# Altium footprint library Gate Driver Board.PcbLib: 123 footprints (part 7 of 8)
Each footprint in its own frame and in the unit in brackets; x right, y up, seen from the top. Pads: shape width x height; smd on the part's side, far side on the other; paste and mask are expansions set on the pad; w line width, h text height; cw(c..) or ccw(c..) is an arc to the next point about the centre after c.
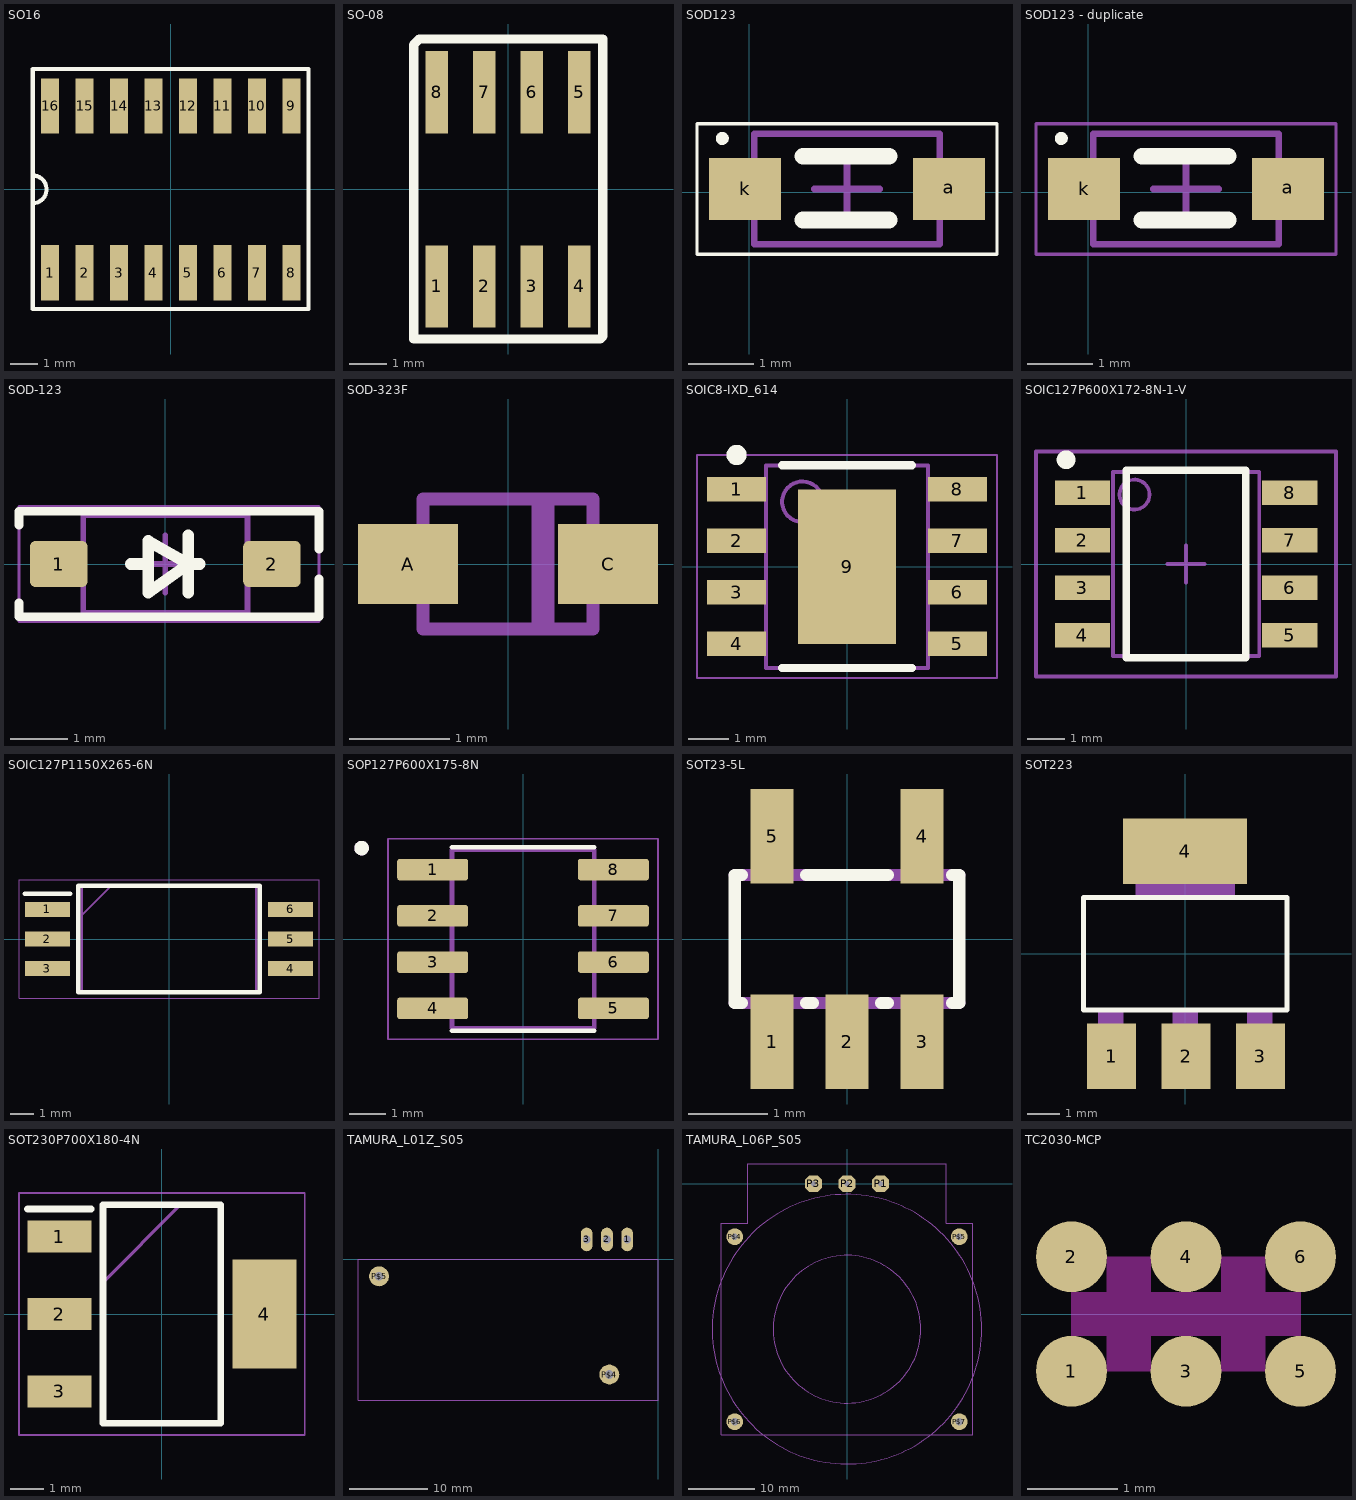
[diagram p6: the footprints below, top view; thin cyan lines are the x and y axes]

## SO16 [mil] "SO16"
pads (16):
  rect 26x80 smd: 1(-175,-121) 2(-125,-121) 3(-75,-121) 4(-25,-121) 5(25,-121) 6(75,-121) 7(125,-121) 8(175,-121) 9(175,121) 10(125,121) 11(75,121) 12(25,121) 13(-25,121) 14(-75,121) 15(-125,121) 16(-175,121)
Top Overlay:
  lines w6: -200,-20 ccw(c-200,0) -200,20 ; 200,-77 200,77 ; -200,-173.46 -200,-77 -200,174.44 200,174.44 200,-173.46 -183.03,-173.46 -200,-173.46
3D body "SOIC16 narrow.stp": height 78.74, standoff 0.13, extent -200.39,-122.31 196.46,120.34

## SO-08 [mm] "SO-08"
pads (8):
  rect 0.6x2.2 smd: 1(-1.905,-2.6) 2(-0.635,-2.6) 3(0.635,-2.6) 4(1.905,-2.6) 5(1.905,2.6) 6(0.635,2.6) 7(-0.635,2.6) 8(-1.905,2.6)
Top Overlay:
  lines w0.254: -2.525,-4.01 -2.1,-4.01 2.465,-4.01 2.533,-3.942 2.533,4.025 -2.375,4.025 -2.525,3.875 -2.525,-3.775 -2.525,-4.01
Assembly Bottom:
  region: -2.15,2 -2.15,3.1 -1.66,3.1 -1.66,2
  region: -0.88,2 -0.88,3.1 -0.39,3.1 -0.39,2
  region: 0.39,2 0.39,3.1 0.88,3.1 0.88,2
  region: 1.66,2 1.66,3.1 2.15,3.1 2.15,2
  region: 1.66,-3.1 1.66,-2 2.15,-2 2.15,-3.1
  region: 0.39,-3.1 0.39,-2 0.88,-2 0.88,-3.1
  region: -0.88,-3.1 -0.88,-2 -0.39,-2 -0.39,-3.1
  region: -2.15,-3.1 -2.15,-2 -1.66,-2 -1.66,-3.1
3D body: height 1.27, standoff 0, extent 1.605,1.5 2.205,3.7
3D body: height 1.27, standoff 0, extent 0.335,1.5 0.935,3.7
3D body: height 1.27, standoff 0, extent -2.205,1.5 -1.605,3.7
3D body: height 1.27, standoff 0, extent 1.605,-3.7 2.205,-1.5
3D body: height 1.27, standoff 0, extent 0.335,-3.7 0.935,-1.5
3D body: height 1.27, standoff 0, extent -2.205,-3.7 -1.605,-1.5
3D body: height 1.27, standoff 0, extent -0.935,1.5 -0.335,3.7
3D body: height 1.27, standoff 0, extent -0.935,-3.7 -0.335,-1.5
3D body: height 3.81, standoff 0, extent -2.15,2 -1.66,3.1
3D body: height 3.81, standoff 0, extent -0.88,2 -0.39,3.1
3D body: height 3.81, standoff 0, extent 0.39,2 0.88,3.1
3D body: height 3.81, standoff 0, extent 1.66,2 2.15,3.1
3D body: height 3.81, standoff 0, extent 1.66,-3.1 2.15,-2
3D body: height 3.81, standoff 0, extent 0.39,-3.1 0.88,-2
3D body: height 3.81, standoff 0, extent -0.88,-3.1 -0.39,-2
3D body: height 3.81, standoff 0, extent -2.15,-3.1 -1.66,-2
3D body "SOIC08 narrow.stp": height 2, standoff 0, extent 3.243,-1.675 9.407,3.325

## SOD123 [mm]
height 1.35
pads (2):
  rect 1.1x0.95 smd: a(3.063,0.05) k(-0.062,0.05)
Top Overlay:
  circle w0.1: c-0.412,0.825 r0.05
  lines w0.05: -0.8,-0.95 3.8,-0.95 3.8,1.05 -0.8,1.05 -0.8,-0.95
  lines w0.254: 0.825,-0.425 2.15,-0.425 ; 0.825,0.55 2.15,0.55
Assembly Top:
  lines w0.1: 0.075,-0.8 2.925,-0.8 2.925,0.9 0.075,0.9 0.075,-0.8
Courtyard Top:
  lines w0.1: 1,0.05 2,0.05 ; 1.5,-0.45 1.5,0.55
3D body "CircuitWorks-SOD123.STEP": height 1.28, standoff 0.01, extent -0.375,-0.775 3.325,0.825

## SOD123 - duplicate [mm]
height 1.35
pads (2):
  rect 1.1x0.95 smd: a(3.063,0.05) k(-0.062,0.05)
Top Overlay:
  circle w0.1: c-0.412,0.825 r0.05
  lines w0.254: 0.825,-0.425 2.15,-0.425 ; 0.825,0.55 2.15,0.55
Assembly Top:
  lines w0.1: 0.075,-0.8 0.075,0.9 2.925,0.9 2.925,-0.8 0.075,-0.8
Courtyard Top:
  lines w0.05: -0.8,-0.95 -0.8,1.05 3.8,1.05 3.8,-0.95 -0.8,-0.95
  lines w0.1: 1,0.05 2,0.05 ; 1.5,-0.45 1.5,0.55
3D body "CircuitWorks-SOD123.STEP": height 1.28, standoff 0.01, extent -0.375,-0.775 3.325,0.825

## SOD-123 [mm] "SOD, 2-Leads, Body 1.55x3.70mm, IPC Medium Density"
height 1.35
pads (2):
  rrect25% 1x0.8 smd: 1(-1.85,0) 2(1.85,0)
Top Overlay:
  lines w0.15: -2.54,-0.675 -2.54,-0.916 2.286,-0.916 2.667,-0.916 2.667,-0.254 ; -2.54,0.675 -2.54,0.916 2.286,0.916 2.667,0.916 2.667,0.254
  lines w0.2: -0.6,0 -0.3,0 ; 0.4,-0.5 0.4,0.5 ; 0.6,0 0.4,0 ; 0.4,0 -0.3,-0.5 -0.3,0.4 0.4,0
Mechanical 13:
  lines w0.1: -1.425,-0.85 1.425,-0.85 1.425,0.85 -1.425,0.85 -1.425,-0.85
Mechanical 15:
  lines w0.05: -2.54,-1 2.667,-1 2.667,1 -2.54,1 -2.54,-1
  lines w0.1: -0.5,0 0.5,0 ; 0,-0.5 0,0.5
3D body "SOD123.STEP": height 1.18, standoff 0, extent -1.95,-0.9 1.95,0.9

## SOD-323F [mm] "SOD-323F"
pads (2):
  rect 1x0.8 smd: A(-1,0) C(1,0)
Assembly Bottom:
  lines w0.127: -0.9,-0.2 -1.2,-0.2 -1.2,0.2 -0.9,0.2 ; 0.9,-0.2 1.2,-0.2 1.2,0.2 0.9,0.2
3D Body Bottom:
  lines w0.127: 0.3,0.6 0.3,-0.6 0.4,-0.6 0.4,0.6 ; -0.85,-0.65 -0.85,0.65 0.85,0.65 0.85,-0.65 -0.85,-0.65

## SOIC8-IXD_614 [mm]
height 1.7
pads (9):
  rect 1.45x0.6 smd: 1(-2.725,1.905) 2(-2.725,0.635) 3(-2.725,-0.635) 4(-2.725,-1.905) 5(2.725,-1.905) 6(2.725,-0.635) 7(2.725,0.635) 8(2.725,1.905)
  rect 2.41x3.81 smd: 9(0,0)
Top Overlay:
  circle w0.25: c-2.725,2.755 r0.125
  lines w0.2: -1.6,-2.5 1.6,-2.5 ; -1.6,2.5 1.6,2.5
Assembly Top:
  circle w0.1: c-1.1,1.6 r0.5
  lines w0.1: -2,-2.5 -2,2.5 2,2.5 2,-2.5 -2,-2.5
Courtyard Top:
  lines w0.05: -3.7,-2.75 -3.7,2.75 3.7,2.75 3.7,-2.75 -3.7,-2.75
  lines w0.1: -0.5,0 0.5,0 ; 0,-0.5 0,0.5
3D body "SOIC8-IXD_614.step": height 1.7, standoff 0, extent -3,-2.5 3,2.5

## SOIC127P600X172-8N-1-V [mm] "SOIC,1.27mm pitch;8 pin,3.90mm W X 4.90mm L X 1.72mm H body"
height 1.72
pads (8):
  rect 1.47x0.65 smd paste+0 mask+0: 1(-2.765,1.905) 2(-2.765,0.635) 3(-2.765,-0.635) 4(-2.765,-1.905) 5(2.765,-1.905) 6(2.765,-0.635) 7(2.765,0.635) 8(2.765,1.905)
Top Overlay:
  circle w0.25: c-3.2,2.78 r0.125
  lines w0.2: -1.6,-2.5 1.6,-2.5 1.6,2.5 -1.6,2.5 -1.6,-2.5
Assembly Bottom:
  text ".DESIGNATOR" at 0,0 h0.5
Mechanical 13:
  circle w0.1: c-1.372,1.852 r0.4
  lines w0.1: -1.95,-2.45 1.95,-2.45 1.95,2.45 -1.95,2.45 -1.95,-2.45
Mechanical 15:
  lines w0.1: -0.5,0 0.5,0 ; 0,-0.5 0,0.5 ; -4,-3 4,-3 4,3 -4,3 -4,-3
3D body "PG-DSO-8-69_Z8B00186941_V02_3D.STEP": height 1.73, standoff 0, extent -3,-2.45 3,2.45

## SOIC127P1150X265-6N [mm]
pads (6):
  rect 1.95x0.65 smd: 1(-5.225,1.27) 2(-5.225,0) 3(-5.225,-1.27) 4(5.225,-1.27) 5(5.225,0) 6(5.225,1.27)
Top Overlay:
  lines w0.2: -6.2,1.945 -4.25,1.945 ; -3.9,-2.29 3.9,-2.29 3.9,2.29 -3.9,2.29 -3.9,-2.29
Mechanical 13:
  lines w0.1: -3.75,1.02 -2.48,2.29 ; -3.75,-2.29 3.75,-2.29 3.75,2.29 -3.75,2.29 -3.75,-2.29
Mechanical 15:
  lines w0.05: -6.45,-2.54 6.45,-2.54 6.45,2.54 -6.45,2.54 -6.45,-2.54
3D body "Si8261ACD-C-IS.stp": height 2.65, standoff 0, extent -5.75,-2.29 5.75,2.29

## SOP127P600X175-8N [mm]
pads (8):
  rrect25% 1.95x0.59 smd: 1(-2.48,1.905) 2(-2.48,0.635) 3(-2.48,-0.635) 4(-2.48,-1.905) 5(2.48,-1.905) 6(2.48,-0.635) 7(2.48,0.635) 8(2.48,1.905)
Top Overlay:
  circle w0.2: c-4.43,2.495 r0.1
  lines w0.127: -1.95,-2.52 1.95,-2.52 ; -1.95,2.52 1.95,2.52
Mechanical 13:
  circle w0.2: c-4.43,2.495 r0.1
  lines w0.127: -1.95,-2.45 -1.95,2.45 1.95,2.45 1.95,-2.45 -1.95,-2.45
Mechanical 15:
  lines w0.05: -3.705,-2.75 -3.705,2.75 3.705,2.75 3.705,-2.75 -3.705,-2.75
3D body "step_temp.STEP": height 2.1, standoff 0, extent -3,-2.425 3,2.425

## SOT23-5L [mm] "SOT23-5L"
pads (5):
  rect 0.55x1.2 smd: 1(-0.95,-1.3) 2(0,-1.3) 3(0.95,-1.3) 4(0.95,1.3) 5(-0.95,1.3)
Top Overlay:
  lines w0.152: -1.328,-0.81 -1.422,-0.81 -1.422,0.81 -1.328,0.81 ; -0.522,-0.81 -0.428,-0.81 ; -0.522,0.81 0.522,0.81 ; 0.428,-0.81 0.522,-0.81 ; 1.328,-0.81 1.422,-0.81 1.422,0.81 1.328,0.81
Assembly Bottom:
  region: -1.2,0.85 -1.2,1.5 -0.7,1.5 -0.7,0.85
  region: 0.7,0.85 0.7,1.5 1.2,1.5 1.2,0.85
  region: 0.7,-1.5 0.7,-0.85 1.2,-0.85 1.2,-1.5
  region: -0.25,-1.5 -0.25,-0.85 0.25,-0.85 0.25,-1.5
  region: -1.2,-1.5 -1.2,-0.85 -0.7,-0.85 -0.7,-1.5
  lines w0.152: -1.422,-0.81 1.422,-0.81 ; -1.422,0.81 1.422,0.81
3D body "SOT23_5.stp": height 0.92, standoff 0.01, extent -1.5,-1.675 1.5,1.53

## SOT223 [mil] "SOT223"
pads (4):
  rect 59x79 smd: 1(-89,-124) 2(1,-124) 3(91,-124)
  rect 150x79 smd: 4(0,124)
Top Overlay:
  lines w6: -122.99,-68.07 122.99,-68.07 122.99,68.15 -122.99,68.15 -122.99,-68.07
Assembly Bottom:
  region: -15,-130 -15,-70 15,-70 15,-130
  region: 75,-130 75,-70 105,-70 105,-130
  region: -105,-130 -105,-70 -75,-70 -75,-130
  region: -60,70 -60,130 60,130 60,70
3D body "SOT223.STEP": height 63.49, standoff -3.42, extent -123.03,-142.69 132.87,133.86

## SOT230P700X180-4N [mm]
pads (4):
  rect 1.9x0.95 smd: 1(-3.05,2.3) 2(-3.05,0) 3(-3.05,-2.3)
  rect 1.9x3.25 smd: 4(3.05,0)
Top Overlay:
  lines w0.2: -4,3.125 -2.1,3.125 ; -1.75,-3.25 1.75,-3.25 1.75,3.25 -1.75,3.25 -1.75,-3.25
Mechanical 13:
  lines w0.1: -1.75,0.95 0.55,3.25 ; -1.75,-3.25 1.75,-3.25 1.75,3.25 -1.75,3.25 -1.75,-3.25
Mechanical 15:
  lines w0.05: -4.25,-3.6 4.25,-3.6 4.25,3.6 -4.25,3.6 -4.25,-3.6
3D body "IRFL9110PBF.stp": height 1.8, standoff 0, extent -3.5,-3.25 3.5,3.25

## TAMURA_L01Z_S05 [mm] "TAMURA_L01Z_S05"
pads (5):
  oval 1.508x3.016 / inner round 0 / far side oval 1.508x3.016 hole 1: 1(-3.92,2.5) 2(-6.5,2.5) 3(-9.08,2.5)
  round 2.54 / inner round 0 / far side round 2.54 hole 1.1: P$4(-6.2,-14.7) P$5(-35.52,-2.2)
3D Body Bottom:
  lines w0.127: -38.2,-18 0,-18 0,0 -38.2,0 -38.2,-18
  text "L01Z    S05" at -29.21,-10.16 h3.94
3D body: height 1.27, standoff 0, extent -36.801,-3.481 -34.239,-0.919
3D body: height 1.27, standoff 0, extent -7.481,-15.981 -4.919,-13.419
3D body: height 1.27, standoff 0, extent -9.84,0.986 -8.319,4.015
3D body: height 1.27, standoff 0, extent -7.261,0.986 -5.74,4.015
3D body: height 1.27, standoff 0, extent -4.68,0.986 -3.159,4.015

## TAMURA_L06P_S05 [mm] "TAMURA_L06P_S05"
pads (7):
  oct 2.54x2.54 / inner round 0 / far side oct 2.54x2.54 hole 0.8: P1(5.08,0) P2(0,0) P3(-5.08,0)
  round 2.54 / inner round 0 / far side round 2.54 hole 1: P$4(-17,-8) P$5(17,-8)
  round 2.54 / inner round 0 / far side round 2.54 hole 1.1: P$6(-17,-36) P$7(17,-36)
3D Body Bottom:
  circle w0.127: c0,-22 r11.18
  circle w0.127: c0,-22 r20.396
  lines w0.127: -19,-38 19,-38 19,-6 15,-6 15,3 -15,3 -15,-6 -19,-6 -19,-38
3D body: height 1.27, standoff 0, extent -1.183,-1.183 1.183,1.183
3D body: height 1.27, standoff 0, extent -6.263,-1.183 -3.897,1.183
3D body: height 1.27, standoff 0, extent 3.897,-1.183 6.263,1.183
3D body: height 1.27, standoff 0, extent -18.281,-9.281 -15.719,-6.719
3D body: height 1.27, standoff 0, extent 15.719,-9.281 18.281,-6.719
3D body: height 1.27, standoff 0, extent -18.281,-37.281 -15.719,-34.719
3D body: height 1.27, standoff 0, extent 15.719,-37.281 18.281,-34.719

## TC2030-MCP [mil] "TC2030-MCP"
pads (6):
  rrect100% 31x31 smd paste+0: 1(50,-25) 2(50,25) 3(100,-25) 4(100,25) 5(150,-25) 6(150,25)
Top Layer keep-out:
  region: 50,-9.5 65.5,-9.5 65.5,-25 84.5,-25 84.5,-9.5 115.5,-9.5 115.5,-25 134.5,-25 134.5,-9.5 150,-9.5 150,9.5 134.5,9.5 134.5,25 115.5,25 115.5,9.5 84.5,9.5 84.5,25 65.5,25 65.5,9.5 50,9.5